# Altium footprint library SomoPowerPackControl.PcbLib: 145 footprints (part 1 of 10)
Each footprint in its own frame and in the unit in brackets; x right, y up, seen from the top. Pads: shape width x height; smd on the part's side, far side on the other; paste and mask are expansions set on the pad; w line width, h text height; cw(c..) or ccw(c..) is an arc to the next point about the centre after c.
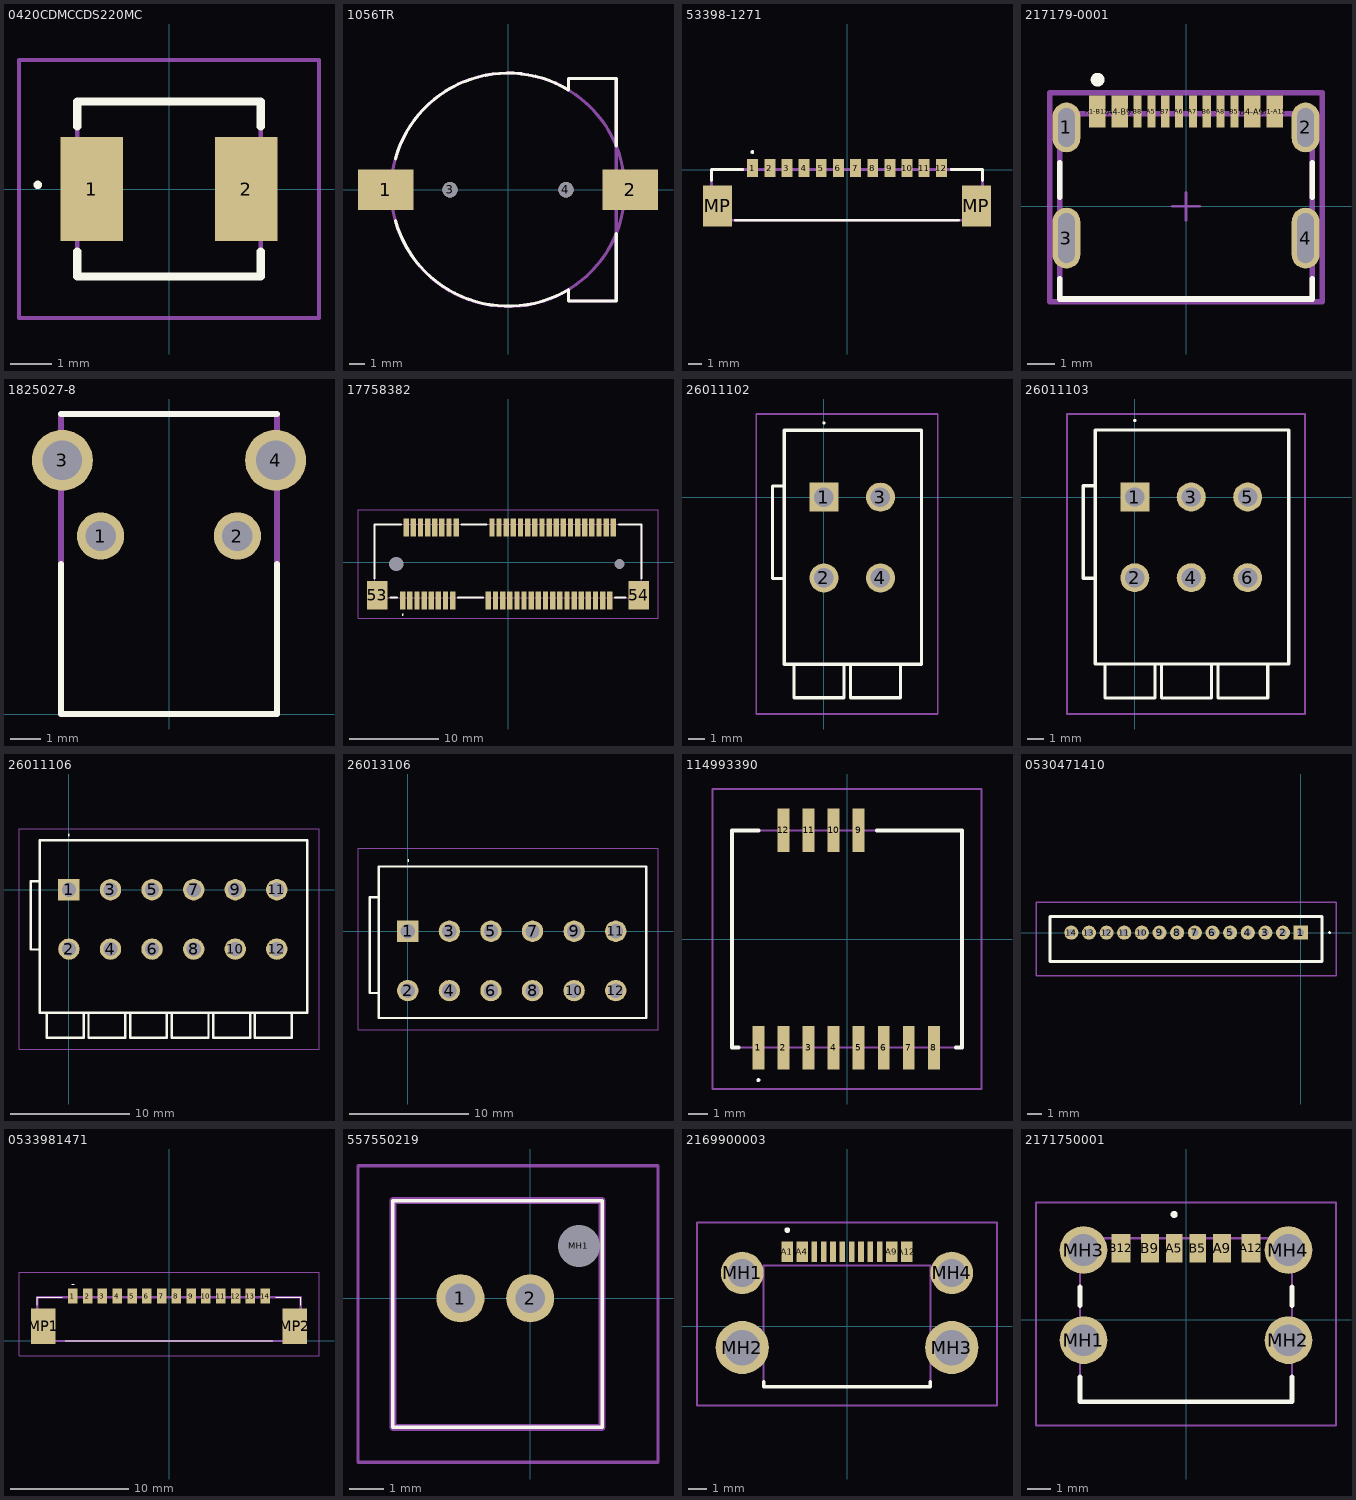
[diagram p0: the footprints below, top view; thin cyan lines are the x and y axes]

## 0420CDMCCDS220MC [mm]
pads (2):
  rect 1.5x2.5 smd: 1(-1.85,0) 2(1.85,0)
Top Overlay:
  lines w0.1: -3.2,0.1 cw(c-3.15,0.1) -3.1,0.1 cw(c-3.15,0.1) -3.2,0.1
  lines w0.2: -2.2,-1.5 -2.2,-2.1 2.2,-2.1 2.2,-1.5 ; -2.2,1.5 -2.2,2.1 2.2,2.1 2.2,1.5
Mechanical 13:
  lines w0.1: -2.2,-2.1 -2.2,2.1 2.2,2.1 2.2,-2.1 -2.2,-2.1
Mechanical 15:
  lines w0.1: -3.6,-3.1 -3.6,3.1 3.6,3.1 3.6,-3.1 -3.6,-3.1
3D body "0420CDMCCDS-220MC.stp": height 2.2, standoff -2.2, extent -2.1,-0.1 2.1,1.65

## 1056TR [mm]
pads (4):
  rect 3.6x2.6 smd: 1(-7.9,0) 2(7.9,0)
  round 1 hole 1 unplated: 3(-3.75,0) 4(3.75,0)
Top Overlay:
  lines w0.2: -7.279,-2.005 ccw(c0.025,0.062) 3.911,-6.458 ; -7.279,2.005 cw(c0,0) 3.911,6.458 ; 3.909,-6.438 3.909,-7.2 7,-7.2 7,-2.829 ; 3.909,6.459 3.909,7.2 7,7.2 7,2.829
Mechanical 13:
  circle w0.2: c0,0 r7.55
  lines w0.2: 3.909,-6.438 3.909,-7.2 7,-7.2 7,7.2 3.909,7.2 3.909,6.439
3D body "1056TR.stp": height 3.99, standoff -1.12, extent -9.398,-7.655 9.398,7.755

## 53398-1271 [mm]
pads (14):
  rect 0.8x1.3 smd: 1(-6.875,0.1) 2(-5.625,0.1) 3(-4.375,0.1) 4(-3.125,0.1) 5(-1.875,0.1) 6(-0.625,0.1) 7(0.625,0.1) 8(1.875,0.1) 9(3.125,0.1) 10(4.375,0.1) 11(5.625,0.1) 12(6.875,0.1)
  rect 2.1x3 smd: MP(-9.425,-2.65) MP(9.425,-2.65)
Top Overlay:
  circle w0.2: c-6.897,1.276 r0.038
  lines w0.2: -9.875,-0.803 -9.875,0 -7.6,0 ; -8.127,-3.7 8.127,-3.7 ; 7.6,0 9.875,0 9.875,-0.803
Mechanical 13:
  lines w0.2: -9.875,-3.7 9.875,-3.7 9.875,0 -9.875,0 -9.875,-3.7
3D body "0533981271.stp": height 4.7, standoff 0, extent -10.075,-3.49 10.075,0.71

## 217179-0001 [mm]
pads (16):
  rrect100% 1x1.8 hole 1.4 slot 0.6 at 0 deg paste-2539.97 mask+0: 1(-4.32,2.85) 2(4.32,2.85)
  rrect100% 1x2.2 hole 1.8 slot 0.6 at 0 deg paste-2539.97 mask+0: 3(-4.32,-1.15) 4(4.32,-1.15)
  rect 0.6x1.15 smd paste+0 mask+0: A1-B12(-3.2,3.425) A4-B9(-2.4,3.425) B1-A12(3.2,3.425) B4-A9(2.4,3.425)
  rect 0.3x1.15 smd paste+0 mask+0: A5(-1.25,3.425) A6(-0.25,3.425) A7(0.25,3.425) A8(1.25,3.425) B5(1.75,3.425) B6(0.75,3.425) B7(-0.75,3.425) B8(-1.75,3.425)
Top Overlay:
  circle w0.25: c-3.195,4.575 r0.125
  lines w0.2: -4.57,-2.625 -4.57,-3.35 4.57,-3.35 4.57,-2.625 ; -4.57,0.325 -4.57,1.575 ; 4.57,0.325 4.57,1.575
Top 3D Body:
  lines w0.2: -4.57,-3.35 -4.57,3.35 4.57,3.35 4.57,-3.35 -4.57,-3.35
Top Courtyard:
  lines w0.2: -4.92,-3.45 -4.92,4.1 4.92,4.1 4.92,-3.45 -4.92,-3.45
Top Assembly:
  lines w0.2: -4.92,-3.45 -4.92,4.1 4.92,4.1 4.92,-3.45 -4.92,-3.45
Top Component Center:
  lines w0.1: -0.5,0 0.5,0 ; 0,-0.5 0,0.5
3D body "Conn_Molex_2171790001_eec.STEP": height 0.25, standoff 0, extent -4.92,-3.45 4.92,4.1

## 1825027-8 [mm]
pads (4):
  round 1.55 hole 1: 1(-2.25,5.85) 2(2.25,5.85)
  round 2 hole 1.3: 3(-3.505,8.34) 4(3.505,8.34)
Top Overlay:
  lines w0.2: -3.555,4.93 -3.555,0 3.555,0 3.555,4.93 ; -3.555,9.86 3.555,9.86
Mechanical 13:
  lines w0.2: -3.555,0 -3.555,9.86 3.555,9.86 3.555,0 -3.555,0
3D body "1825027-8.stp": height 7.13, standoff -3.39, extent -4.204,0.009 4.204,9.851

## 17758382 [mm]
pads (56):
  rect 0.6x2 smd: 1(-11.8,-4.27) 2(-11.4,3.93) 3(-11,-4.27) 4(-10.6,3.93) 5(-10.2,-4.27) 6(-9.8,3.93) 7(-9.4,-4.27) 8(-9,3.93) 9(-8.6,-4.27) 10(-8.2,3.93) 11(-7.8,-4.27) 12(-7.4,3.93) 13(-7,-4.27) 14(-6.6,3.93) 15(-6.2,-4.27) 16(-5.8,3.93) 17(-2.2,-4.27) 18(-1.8,3.93) 19(-1.4,-4.27) 20(-1,3.93) 21(-0.6,-4.27) 22(-0.2,3.93) 23(0.2,-4.27) 24(0.6,3.93) 25(1,-4.27) 26(1.4,3.93) 27(1.8,-4.27) 28(2.2,3.93) 29(2.6,-4.27) 30(3,3.93) 31(3.4,-4.27) 32(3.8,3.93) 33(4.2,-4.27) 34(4.6,3.93) 35(5,-4.27) 36(5.4,3.93) 37(5.8,-4.27) 38(6.2,3.93) 39(6.6,-4.27) 40(7,3.93) 41(7.4,-4.27) 42(7.8,3.93) 43(8.2,-4.27) 44(8.6,3.93) 45(9,-4.27) 46(9.4,3.93) 47(9.8,-4.27) 48(10.2,3.93) 49(10.6,-4.27) 50(11,3.93) 51(11.4,-4.27) 52(11.8,3.93)
  rect 2.3x3.2 smd: 53(-14.65,-3.67) 54(14.65,-3.67)
  round 0.8 hole 1.6 unplated: 55(-12.5,-0.17)
  round 0.55 hole 1.1 unplated: 56(12.5,-0.17)
Top Overlay:
  lines w0.1: -11.8,-5.9 cw(c-11.8,-5.85) -11.8,-5.8 cw(c-11.8,-5.85) -11.8,-5.9
  lines w0.2: -14.95,-1.8 -14.95,4.27 -12,4.27 ; -13.2,-3.93 -12.4,-3.93 ; -5.6,-3.93 -2.8,-3.93 ; -5.2,4.27 -2.4,4.27 ; 12,-3.93 13.2,-3.93 ; 12.4,4.27 14.95,4.27 14.95,-1.8
Mechanical 13:
  lines w0.1: -14.95,-3.93 -14.95,4.27 14.95,4.27 14.95,-3.93 -14.95,-3.93
Mechanical 15:
  lines w0.1: -16.8,-6.27 -16.8,5.93 16.8,5.93 16.8,-6.27 -16.8,-6.27
3D body "1775838-2.stp": height 5.68, standoff -0.58, extent -14.95,-4.54 14.95,4.54

## 26011102 [mm]
pads (4):
  rect 1.8x1.8 hole 1.2: 1(0,0)
  round 1.8 hole 1.2: 2(0,-5) 3(3.5,0) 4(3.5,-5)
Top Overlay:
  lines w0.1: 0,4.55 ccw(c0,4.6) 0,4.65 ccw(c0,4.6) 0,4.55
  lines w0.2: -2.44,-5.034 -3.19,-5.034 -3.19,0.7 -2.44,0.7 ; -1.85,-10.35 -1.85,-12.425 1.25,-12.425 1.25,-10.35 ; 1.65,-10.35 1.65,-12.425 4.75,-12.425 4.75,-10.35 ; -2.45,-10.35 -2.45,4.15 6.05,4.15 6.05,-10.35 -2.45,-10.35
Mechanical 13:
  lines w0.1: -2.45,-10.35 -2.45,4.15 6.05,4.15 6.05,-10.35 -2.45,-10.35
Mechanical 15:
  lines w0.1: -4.19,-13.425 -4.19,5.15 7.05,5.15 7.05,-13.425 -4.19,-13.425
3D body "2601-1102.stp": height 12.79, standoff -3.56, extent -3.2,-12.43 6.05,4.15

## 26011103 [mm]
pads (6):
  rect 1.8x1.8 hole 1.2: 1(0,0)
  round 1.8 hole 1.2: 2(0,-5) 3(3.5,0) 4(3.5,-5) 5(7,0) 6(7,-5)
Top Overlay:
  lines w0.1: 0,4.7 cw(c0,4.75) 0,4.8 cw(c0,4.75) 0,4.7
  lines w0.2: -2.45,-5.034 -3.2,-5.034 -3.2,0.7 -2.45,0.7 ; -1.85,-10.35 -1.85,-12.45 1.25,-12.45 1.25,-10.35 ; 1.65,-10.35 1.65,-12.45 4.75,-12.45 4.75,-10.35 ; 5.16,-10.35 5.16,-12.45 8.25,-12.45 8.25,-10.35 ; -2.45,-10.35 -2.45,4.15 9.55,4.15 9.55,-10.35 -2.45,-10.35
Mechanical 13:
  lines w0.1: -2.45,-10.35 -2.45,4.15 9.55,4.15 9.55,-10.35 -2.45,-10.35
Mechanical 15:
  lines w0.1: -4.2,-13.45 -4.2,5.15 10.55,5.15 10.55,-13.45 -4.2,-13.45
3D body "2601-1103.stp": height 12.75, standoff -3.6, extent -3.2,-12.43 9.55,4.15

## 26011106 [mm]
pads (12):
  rect 1.8x1.8 hole 1.2: 1(0,0)
  round 1.8 hole 1.2: 2(0,-5) 3(3.5,0) 4(3.5,-5) 5(7,0) 6(7,-5) 7(10.5,0) 8(10.5,-5) 9(14,0) 10(14,-5) 11(17.5,0) 12(17.5,-5)
Top Overlay:
  lines w0.1: 0,4.55 ccw(c0,4.6) 0,4.65 ccw(c0,4.6) 0,4.55
  lines w0.2: -2.45,-5.034 -3.2,-5.034 -3.2,0.7 -2.45,0.7 ; -1.85,-10.35 -1.85,-12.45 1.25,-12.45 1.25,-10.35 ; 1.65,-10.35 1.65,-12.45 4.75,-12.45 4.75,-10.35 ; 5.15,-10.35 5.15,-12.45 8.25,-12.45 8.25,-10.35 ; 8.65,-10.35 8.65,-12.45 11.75,-12.45 11.75,-10.35 ; 12.15,-10.35 12.15,-12.45 15.25,-12.45 15.25,-10.35 ; 15.65,-10.35 15.65,-12.45 18.75,-12.45 18.75,-10.35 ; -2.45,-10.35 -2.45,4.15 20.05,4.15 20.05,-10.35 -2.45,-10.35
Mechanical 13:
  lines w0.1: -2.45,-10.35 -2.45,4.15 20.05,4.15 20.05,-10.35 -2.45,-10.35
Mechanical 15:
  lines w0.1: -4.2,-13.45 -4.2,5.15 21.05,5.15 21.05,-13.45 -4.2,-13.45
3D body "2601-1106.stp": height 12.74, standoff -3.61, extent -3.2,-12.44 20.05,4.14

## 26013106 [mm]
pads (12):
  rect 1.8x1.8 hole 1.2: 1(0,0)
  round 1.8 hole 1.2: 2(0,-5) 3(3.5,0) 4(3.5,-5) 5(7,0) 6(7,-5) 7(10.5,0) 8(10.5,-5) 9(14,0) 10(14,-5) 11(17.5,0) 12(17.5,-5)
Top Overlay:
  lines w0.1: 0,5.95 cw(c0.05,5.95) 0.1,5.95 cw(c0.05,5.95) 0,5.95
  lines w0.2: -2.44,-5.2 -3.19,-5.2 -3.19,2.85 -2.44,2.85 ; -2.44,-7.3 -2.44,5.45 20.06,5.45 20.06,-7.3 -2.44,-7.3
Mechanical 13:
  lines w0.1: -2.44,-5.2 -3.19,-5.2 -3.19,2.85 -2.44,2.85 ; -2.44,-7.3 -2.44,5.45 20.06,5.45 20.06,-7.3 -2.44,-7.3
Mechanical 15:
  lines w0.1: -4.19,-8.3 -4.19,6.99 21.06,6.99 21.06,-8.3 -4.19,-8.3
3D body "2601-3106.stp": height 16.6, standoff -3.58, extent -3.19,-7.34 20.06,5.41

## 114993390 [mm]
pads (12):
  rect 0.6x2.2 smd: 1(-4.49,-5.5) 2(-3.22,-5.5) 3(-1.95,-5.5) 4(-0.68,-5.5) 5(0.59,-5.5) 6(1.86,-5.5) 7(3.13,-5.5) 8(4.4,-5.5) 9(0.59,5.5) 10(-0.68,5.5) 11(-1.95,5.5) 12(-3.22,5.5)
Top Overlay:
  lines w0.1: -4.49,-7.2 ccw(c-4.49,-7.15) -4.49,-7.1 ccw(c-4.49,-7.15) -4.49,-7.2
  lines w0.2: -5.49,-5.5 -5.82,-5.5 -5.82,5.5 -4.49,5.5 ; 1.51,5.5 5.82,5.5 5.82,-5.5 5.51,-5.5
Mechanical 13:
  lines w0.1: -5.82,-5.5 -5.82,5.5 5.82,5.5 5.82,-5.5 -5.82,-5.5
Mechanical 15:
  lines w0.1: -6.82,-7.6 -6.82,7.6 6.82,7.6 6.82,-7.6 -6.82,-7.6
3D body "114993390.stp": height 2.95, standoff 0, extent -5.8,-5.5 5.8,5.498

## 0530471410 [mm]
pads (14):
  rect 1x1 hole 0.5: 1(0,0)
  round 1 hole 0.5: 2(-1.25,0) 3(-2.5,0) 4(-3.75,0) 5(-5,0) 6(-6.25,0) 7(-7.5,0) 8(-8.75,0) 9(-10,0) 10(-11.25,0) 11(-12.5,0) 12(-13.75,0) 13(-15,0) 14(-16.25,0)
Top Overlay:
  lines w0.1: 2,0 cw(c2.05,0) 2.1,0 cw(c2.05,0) 2,0
  lines w0.2: -17.75,-2.05 -17.75,1.15 1.5,1.15 1.5,-2.05 -17.75,-2.05
Mechanical 13:
  lines w0.1: -17.75,-2.05 -17.75,1.15 1.5,1.15 1.5,-2.05 -17.75,-2.05
Mechanical 15:
  lines w0.1: -18.75,-3.05 -18.75,2.15 2.5,2.15 2.5,-3.05 -18.75,-3.05
3D body "0530471410.stp": height 4.14, standoff -2.36, extent -17.745,-2.05 1.505,1.15

## 0533981471 [mm]
pads (16):
  rect 0.8x1.3 smd: 1(-8.125,3.8) 2(-6.875,3.8) 3(-5.625,3.8) 4(-4.375,3.8) 5(-3.125,3.8) 6(-1.875,3.8) 7(-0.625,3.8) 8(0.625,3.8) 9(1.875,3.8) 10(3.125,3.8) 11(4.375,3.8) 12(5.625,3.8) 13(6.875,3.8) 14(8.125,3.8)
  rect 2.1x3 smd: MP1(-10.625,1.26) MP2(10.625,1.26)
Top Overlay:
  lines w0.1: -11.125,3 -11.125,3.5 -11.125,3.7 -9,3.7 ; -8.75,0 8.125,0 8.75,0 ; 9,3.7 11.125,3.7 11.125,3 ; -8.2,4.8 -8,4.8 -8.2,4.8
Mechanical 13:
  lines w0.2: -11.125,0 -11.125,3.7 11.125,3.7 11.125,0 -11.125,0
Mechanical 15:
  lines w0.1: -12.675,-1.24 -12.675,5.8 12.675,5.8 12.675,-1.24 -12.675,-1.24
3D body "0533981471.stp": height 4.7, standoff 0, extent -11.325,0.18 11.325,4.38

## 557550219 [mm]
pads (3):
  round 1.381 hole 0.85: 1(-2,0) 2(0,0)
  round 0.6 hole 1.2 unplated: MH1(1.4,1.5)
Top Overlay:
  lines w0.1: -3.935,-3.7 2.065,-3.7 2.065,2.8 -3.935,2.8 -3.935,-3.7
Mechanical 13:
  lines w0.2: -3.935,-3.7 2.065,-3.7 2.065,2.8 -3.935,2.8 -3.935,-3.7
Mechanical 15:
  lines w0.1: -4.935,-4.7 -4.935,3.8 3.665,3.8 3.665,-4.7 -4.935,-4.7
3D body "55755-0219.stp": height 8.84, standoff -3.39, extent -4,-3.7 2,2.8

## 2169900003 [mm]
pads (16):
  rect 0.6x1.1 smd: A1(-3.2,4) A4(-2.4,4) A9(2.4,4) A12(3.2,4)
  rect 0.3x1.1 smd: A5(-1.25,4) A6(-0.25,4) A7(0.25,4) A8(1.25,4) B5(1.75,4) B6(0.75,4) B7(-0.75,4) B8(-1.75,4)
  round 2.28 hole 1.52: MH1(-5.62,2.85) MH4(5.62,2.85)
  round 2.85 hole 1.9: MH2(-5.62,-1.15) MH3(5.62,-1.15)
Top Overlay:
  lines w0.2: -4.47,-3 -4.47,-3.25 4.47,-3.25 4.47,-3 ; -3.2,5.1 cw(c-3.2,5.15) -3.2,5.2 ; -3.2,5.1 ccw(c-3.2,5.15) -3.2,5.2 ; -3.2,5.1 cw(c-3.2,5.15) -3.2,5.2
Mechanical 13:
  lines w0.1: -4.47,-3.25 -4.47,3.25 4.47,3.25 4.47,-3.25 -4.47,-3.25
Mechanical 15:
  lines w0.1: -8.045,-4.25 -8.045,5.55 8.045,5.55 8.045,-4.25 -8.045,-4.25
3D body "216990-0003.stp": height 2.16, standoff -1.02, extent -5.77,-2.95 5.77,4.25

## 2171750001 [mm]
pads (10):
  rect 0.7x1.2 smd: A5(-0.5,3.03) B5(0.5,3.03)
  rect 0.76x1.2 smd: A9(1.52,3.03) B9(-1.52,3.03)
  rect 0.8x1.2 smd: A12(2.75,3.03) B12(-2.75,3.03)
  round 2.01 hole 1.34: MH1(-4.32,-0.85) MH2(4.32,-0.85) MH3(-4.32,2.95) MH4(4.32,2.95)
Top Overlay:
  lines w0.2: -4.47,-2.4 -4.47,-3.45 4.47,-3.45 4.47,-2.4 ; -4.47,0.6 -4.47,1.4 ; 4.47,0.6 4.47,1.4 ; -0.5,4.4 cw(c-0.5,4.45) -0.5,4.5 ; -0.5,4.4 ccw(c-0.5,4.45) -0.5,4.5 ; -0.5,4.4 cw(c-0.5,4.45) -0.5,4.5
Mechanical 13:
  lines w0.1: -4.47,-3.45 -4.47,3.45 4.47,3.45 4.47,-3.45 -4.47,-3.45
Mechanical 15:
  lines w0.1: -6.325,-4.45 -6.325,4.955 6.325,4.955 6.325,-4.45 -6.325,-4.45
3D body "217175-0001.stp": height 3.26, standoff -1.9, extent -4.47,-3.44 4.47,3.46